# Altium schematic symbol library IC_ADI.SCHLIB: 3169 symbols (part 27 of 181)
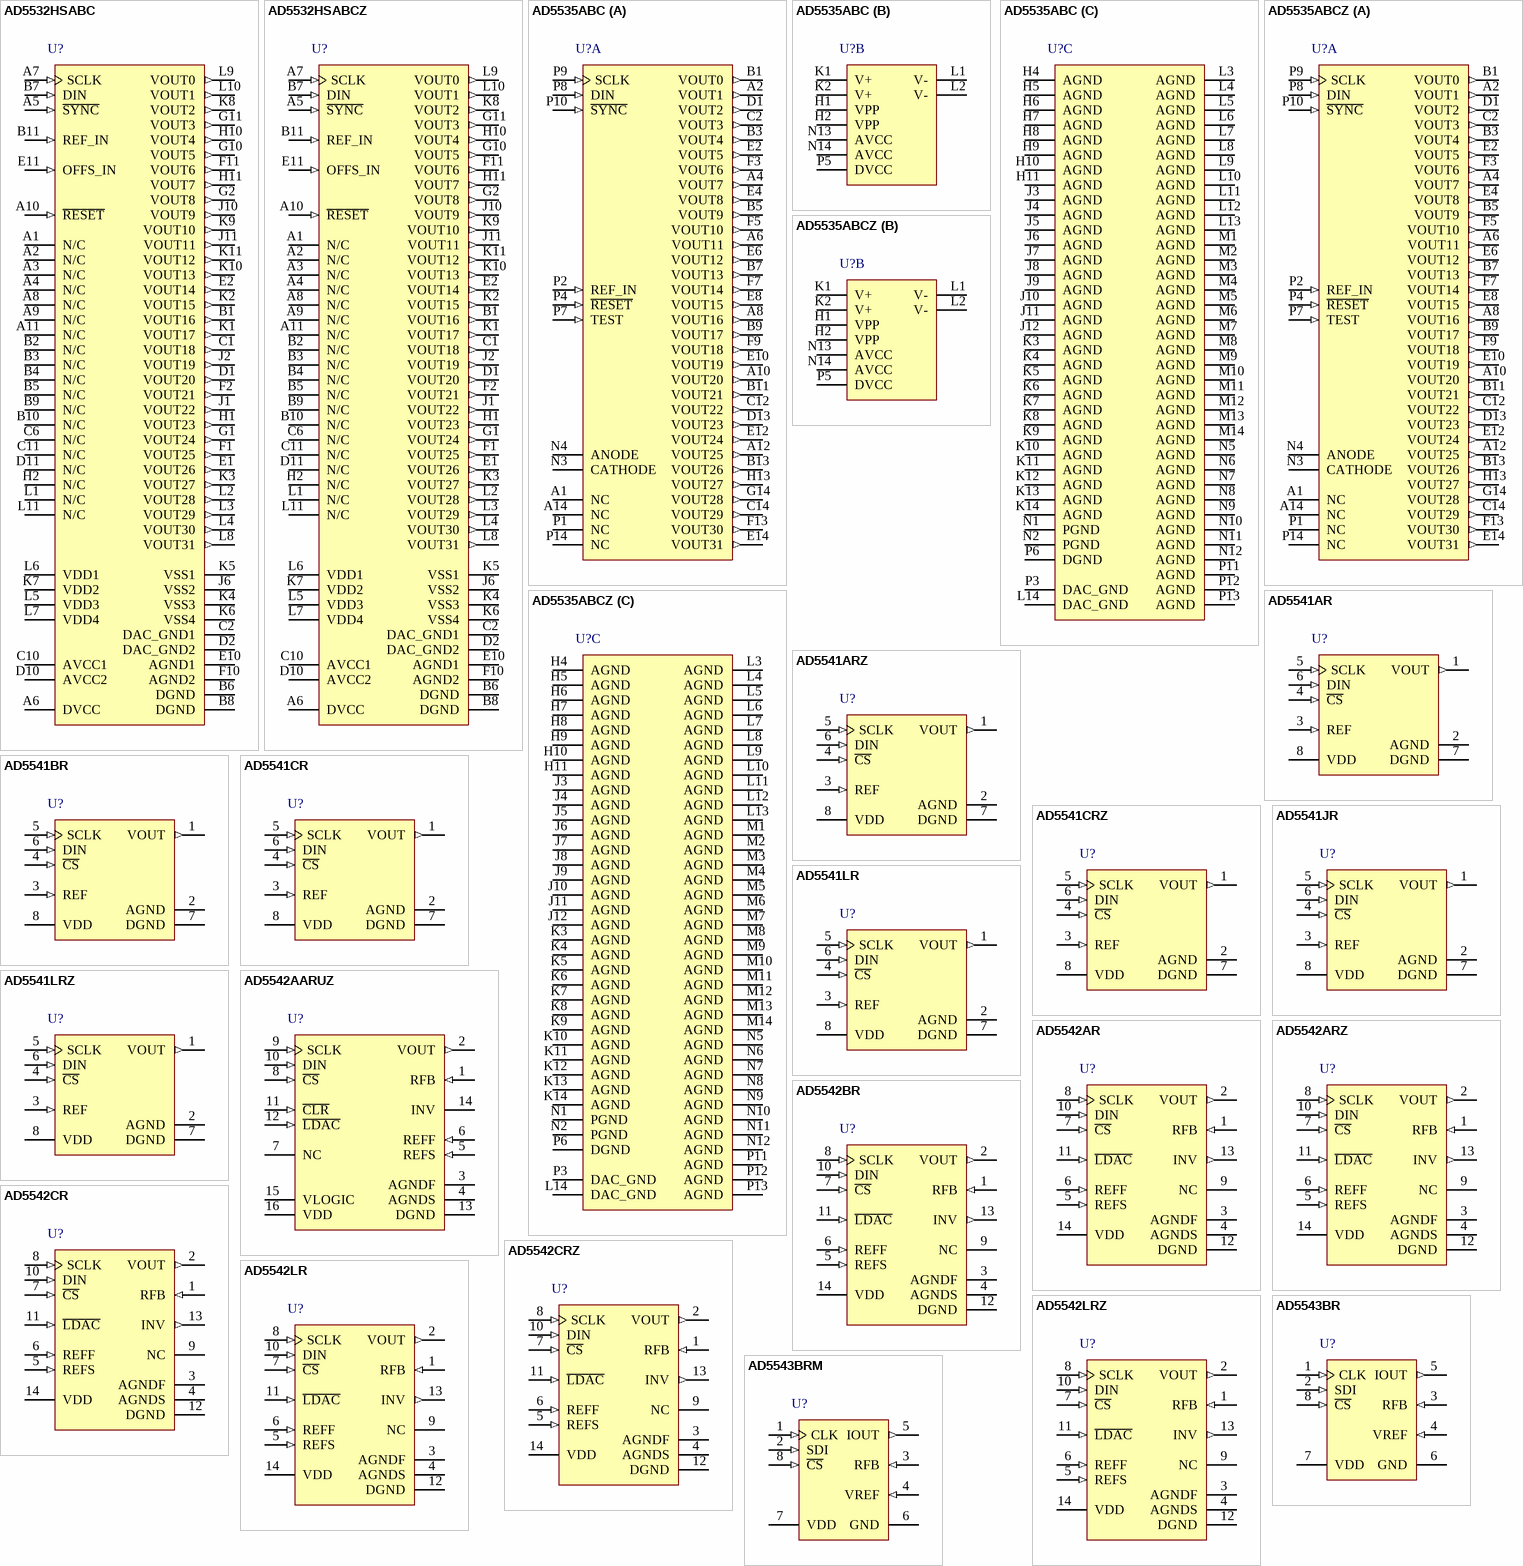
[diagram p217: symbols AD5532HSABC to AD5543BRM]

## AD5541AR
designator U?
Single 16-Bit Digital-to-Analog Converter with Serial Interface, 2.7 to 5.5 V, -40 to +85 degC, R-8, Tube; Generic Part Number: AD5541; PartNumber: AD5541AR; # DAC Outputs: 1; Max V+: 5.5V; Op Pwr Diss: 6.05mW; Resolution (Bits): 16; Settling Time: 1祍; Single Supply: Yes; DatasheetVersion: Rev.F; PackageVersion: 060506-A; PackageReference: R-8; PackageDescription: 8-Lead Standard Small Outline Package [SOIC_N] Narrow Body; Supplier Part Number 1: AD5541AR-ND; Supplier Part Number 2: 584-AD5541AR; Packing: Tube; RoHS: N; Mounting Technology: Surface Mount; Code_JEDEC: MS-012-AA; Code_IPC: SOIC127P600-8; ComponentLink1Description: Manufacturer URL; ComponentLink2Description: Datasheet; ComponentLink3Description: Package Specification; ComponentLink4Description: Product URL; ComponentLink5Description: Reference Design URL
footprint SOIC8_1.27 (Footprint not found)
pins: 1 VOUT (out) "Analog Output Voltage from the DAC.", 2 AGND (power) "Ground Reference Point for Analog Circuitry.", 3 REF (in) "Voltage Reference Input for the DAC. Connect to an external 2.5 V reference. Reference can range from 2 V to VDD.", 4 ~{CS} (in) "Logic Input Signal. The chip select signal is used to frame the serial data input.", 5 SCLK (in) "Clock Input. Data is clocked into the input register on the rising edge of SCLK. Duty cycle must be between 40% and 60%.", 6 DIN (in) "Serial Data Input. This device accepts 16-bit words. Data is clocked into the input register on the rising edge of SCLK.", 7 DGND (power) "Digital Ground. Ground reference for digital circuitry.", 8 VDD (power) "Analog Supply Voltage, 5 V +/- 10%."

## AD5541ARZ
designator U?
Single 16-Bit Digital-to-Analog Converter with Serial Interface, 2.7 to 5.5 V, -40 to +85 degC, R-8, Pb-Free, Tube; Generic Part Number: AD5541; PartNumber: AD5541ARZ; # DAC Outputs: 1; Max V+: 5.5V; Op Pwr Diss: 6.05mW; Resolution (Bits): 16; Settling Time: 1祍; Single Supply: Yes; DatasheetVersion: Rev.F; PackageVersion: 060506-A; PackageReference: R-8; PackageDescription: 8-Lead Standard Small Outline Package [SOIC_N] Narrow Body; Supplier Part Number 1: AD5541ARZ-ND; Supplier Part Number 2: 1838895; Supplier Part Number 3: 19M8816; Supplier Part Number 4: 584-AD5541ARZ; Packing: Tube; RoHS: Y; Mounting Technology: Surface Mount; Code_JEDEC: MS-012-AA; Code_IPC: SOIC127P600-8; ComponentLink1Description: Manufacturer URL; ComponentLink2Description: Datasheet; ComponentLink3Description: Package Specification; ComponentLink4Description: Product URL; ComponentLink5Description: Reference Design URL
footprint SOIC8_1.27 (Footprint not found)
pins: 1 VOUT (out) "Analog Output Voltage from the DAC.", 2 AGND (power) "Ground Reference Point for Analog Circuitry.", 3 REF (in) "Voltage Reference Input for the DAC. Connect to an external 2.5 V reference. Reference can range from 2 V to VDD.", 4 ~{CS} (in) "Logic Input Signal. The chip select signal is used to frame the serial data input.", 5 SCLK (in) "Clock Input. Data is clocked into the input register on the rising edge of SCLK. Duty cycle must be between 40% and 60%.", 6 DIN (in) "Serial Data Input. This device accepts 16-bit words. Data is clocked into the input register on the rising edge of SCLK.", 7 DGND (power) "Digital Ground. Ground reference for digital circuitry.", 8 VDD (power) "Analog Supply Voltage, 5 V +/- 10%."

## AD5541BR
designator U?
Single 16-Bit Digital-to-Analog Converter with Serial Interface, 2.7 to 5.5 V, -40 to +85 degC, R-8, Tube; Generic Part Number: AD5541; PartNumber: AD5541BR; # DAC Outputs: 1; Max V+: 5.5V; Op Pwr Diss: 6.05mW; Resolution (Bits): 16; Settling Time: 1祍; Single Supply: Yes; DatasheetVersion: Rev.F; PackageVersion: 060506-A; PackageReference: R-8; PackageDescription: 8-Lead Standard Small Outline Package [SOIC_N] Narrow Body; Supplier Part Number 1: AD5541BR-ND; Supplier Part Number 2: 584-AD5541BR; Packing: Tube; RoHS: N; Mounting Technology: Surface Mount; Code_JEDEC: MS-012-AA; Code_IPC: SOIC127P600-8; ComponentLink1Description: Manufacturer URL; ComponentLink2Description: Datasheet; ComponentLink3Description: Package Specification; ComponentLink4Description: Product URL; ComponentLink5Description: Reference Design URL
footprint SOIC8_1.27 (Footprint not found)
pins: 1 VOUT (out) "Analog Output Voltage from the DAC.", 2 AGND (power) "Ground Reference Point for Analog Circuitry.", 3 REF (in) "Voltage Reference Input for the DAC. Connect to an external 2.5 V reference. Reference can range from 2 V to VDD.", 4 ~{CS} (in) "Logic Input Signal. The chip select signal is used to frame the serial data input.", 5 SCLK (in) "Clock Input. Data is clocked into the input register on the rising edge of SCLK. Duty cycle must be between 40% and 60%.", 6 DIN (in) "Serial Data Input. This device accepts 16-bit words. Data is clocked into the input register on the rising edge of SCLK.", 7 DGND (power) "Digital Ground. Ground reference for digital circuitry.", 8 VDD (power) "Analog Supply Voltage, 5 V +/- 10%."

## AD5541CR
designator U?
Single 16-Bit Digital-to-Analog Converter with Serial Interface, 2.7 to 5.5 V, -40 to +85 degC, R-8, Tube; Generic Part Number: AD5541; PartNumber: AD5541CR; # DAC Outputs: 1; Max V+: 5.5V; Op Pwr Diss: 6.05mW; Resolution (Bits): 16; Settling Time: 1祍; Single Supply: Yes; DatasheetVersion: Rev.F; PackageVersion: 060506-A; PackageReference: R-8; PackageDescription: 8-Lead Standard Small Outline Package [SOIC_N] Narrow Body; Supplier Part Number 1: AD5541CR-ND; Supplier Part Number 2: 584-AD5541CR; Packing: Tube; RoHS: N; Mounting Technology: Surface Mount; Code_JEDEC: MS-012-AA; Code_IPC: SOIC127P600-8; ComponentLink1Description: Manufacturer URL; ComponentLink2Description: Datasheet; ComponentLink3Description: Package Specification; ComponentLink4Description: Product URL; ComponentLink5Description: Reference Design URL
footprint SOIC8_1.27 (Footprint not found)
pins: 1 VOUT (out) "Analog Output Voltage from the DAC.", 2 AGND (power) "Ground Reference Point for Analog Circuitry.", 3 REF (in) "Voltage Reference Input for the DAC. Connect to an external 2.5 V reference. Reference can range from 2 V to VDD.", 4 ~{CS} (in) "Logic Input Signal. The chip select signal is used to frame the serial data input.", 5 SCLK (in) "Clock Input. Data is clocked into the input register on the rising edge of SCLK. Duty cycle must be between 40% and 60%.", 6 DIN (in) "Serial Data Input. This device accepts 16-bit words. Data is clocked into the input register on the rising edge of SCLK.", 7 DGND (power) "Digital Ground. Ground reference for digital circuitry.", 8 VDD (power) "Analog Supply Voltage, 5 V +/- 10%."

## AD5541CRZ
designator U?
Single 16-Bit Digital-to-Analog Converter with Serial Interface, 2.7 to 5.5 V, -40 to +85 degC, R-8, Pb-Free, Tube; Generic Part Number: AD5541; PartNumber: AD5541CRZ; # DAC Outputs: 1; Max V+: 5.5V; Op Pwr Diss: 6.05mW; Resolution (Bits): 16; Settling Time: 1祍; Single Supply: Yes; DatasheetVersion: Rev.F; PackageVersion: 060506-A; PackageReference: R-8; PackageDescription: 8-Lead Standard Small Outline Package [SOIC_N] Narrow Body; Supplier Part Number 1: AD5541CRZ-ND; Supplier Part Number 2: 59K4208; Supplier Part Number 3: 584-AD5541CRZ; Packing: Tube; RoHS: Y; Mounting Technology: Surface Mount; Code_JEDEC: MS-012-AA; Code_IPC: SOIC127P600-8; ComponentLink1Description: Manufacturer URL; ComponentLink2Description: Datasheet; ComponentLink3Description: Package Specification; ComponentLink4Description: Product URL; ComponentLink5Description: Reference Design URL
footprint SOIC8_1.27 (Footprint not found)
pins: 1 VOUT (out) "Analog Output Voltage from the DAC.", 2 AGND (power) "Ground Reference Point for Analog Circuitry.", 3 REF (in) "Voltage Reference Input for the DAC. Connect to an external 2.5 V reference. Reference can range from 2 V to VDD.", 4 ~{CS} (in) "Logic Input Signal. The chip select signal is used to frame the serial data input.", 5 SCLK (in) "Clock Input. Data is clocked into the input register on the rising edge of SCLK. Duty cycle must be between 40% and 60%.", 6 DIN (in) "Serial Data Input. This device accepts 16-bit words. Data is clocked into the input register on the rising edge of SCLK.", 7 DGND (power) "Digital Ground. Ground reference for digital circuitry.", 8 VDD (power) "Analog Supply Voltage, 5 V +/- 10%."

## AD5541JR
designator U?
Single 16-Bit Digital-to-Analog Converter with Serial Interface, 2.7 to 5.5 V, 0 to +70 degC, R-8, Tube; Generic Part Number: AD5541; PartNumber: AD5541JR; # DAC Outputs: 1; Max V+: 5.5V; Op Pwr Diss: 6.05mW; Resolution (Bits): 16; Settling Time: 1祍; Single Supply: Yes; DatasheetVersion: Rev.F; PackageVersion: 060506-A; PackageReference: R-8; PackageDescription: 8-Lead Standard Small Outline Package [SOIC_N] Narrow Body; Supplier Part Number 1: AD5541JR-ND; Supplier Part Number 2: 584-AD5541JR; Packing: Tube; RoHS: N; Mounting Technology: Surface Mount; Code_JEDEC: MS-012-AA; Code_IPC: SOIC127P600-8; ComponentLink1Description: Manufacturer URL; ComponentLink2Description: Datasheet; ComponentLink3Description: Package Specification; ComponentLink4Description: Product URL; ComponentLink5Description: Reference Design URL
footprint SOIC8_1.27 (Footprint not found)
pins: 1 VOUT (out) "Analog Output Voltage from the DAC.", 2 AGND (power) "Ground Reference Point for Analog Circuitry.", 3 REF (in) "Voltage Reference Input for the DAC. Connect to an external 2.5 V reference. Reference can range from 2 V to VDD.", 4 ~{CS} (in) "Logic Input Signal. The chip select signal is used to frame the serial data input.", 5 SCLK (in) "Clock Input. Data is clocked into the input register on the rising edge of SCLK. Duty cycle must be between 40% and 60%.", 6 DIN (in) "Serial Data Input. This device accepts 16-bit words. Data is clocked into the input register on the rising edge of SCLK.", 7 DGND (power) "Digital Ground. Ground reference for digital circuitry.", 8 VDD (power) "Analog Supply Voltage, 5 V +/- 10%."

## AD5541LR
designator U?
Single 16-Bit Digital-to-Analog Converter with Serial Interface, 2.7 to 5.5 V, 0 to +70 degC, R-8, Tube; Generic Part Number: AD5541; PartNumber: AD5541LR; # DAC Outputs: 1; Max V+: 5.5V; Op Pwr Diss: 6.05mW; Resolution (Bits): 16; Settling Time: 1祍; Single Supply: Yes; DatasheetVersion: Rev.F; PackageVersion: 060506-A; PackageReference: R-8; PackageDescription: 8-Lead Standard Small Outline Package [SOIC_N] Narrow Body; Supplier Part Number 1: AD5541LR-ND; Supplier Part Number 2: 584-AD5541LR; Packing: Tube; RoHS: N; Mounting Technology: Surface Mount; Code_JEDEC: MS-012-AA; Code_IPC: SOIC127P600-8; ComponentLink1Description: Manufacturer URL; ComponentLink2Description: Datasheet; ComponentLink3Description: Package Specification; ComponentLink4Description: Product URL; ComponentLink5Description: Reference Design URL
footprint SOIC8_1.27 (Footprint not found)
pins: 1 VOUT (out) "Analog Output Voltage from the DAC.", 2 AGND (power) "Ground Reference Point for Analog Circuitry.", 3 REF (in) "Voltage Reference Input for the DAC. Connect to an external 2.5 V reference. Reference can range from 2 V to VDD.", 4 ~{CS} (in) "Logic Input Signal. The chip select signal is used to frame the serial data input.", 5 SCLK (in) "Clock Input. Data is clocked into the input register on the rising edge of SCLK. Duty cycle must be between 40% and 60%.", 6 DIN (in) "Serial Data Input. This device accepts 16-bit words. Data is clocked into the input register on the rising edge of SCLK.", 7 DGND (power) "Digital Ground. Ground reference for digital circuitry.", 8 VDD (power) "Analog Supply Voltage, 5 V +/- 10%."

## AD5541LRZ
designator U?
Single 16-Bit Digital-to-Analog Converter with Serial Interface, 2.7 to 5.5 V, 0 to +70 degC, R-8, Pb-Free, Tube; Generic Part Number: AD5541; PartNumber: AD5541LRZ; # DAC Outputs: 1; Max V+: 5.5V; Op Pwr Diss: 6.05mW; Resolution (Bits): 16; Settling Time: 1祍; Single Supply: Yes; DatasheetVersion: Rev.F; PackageVersion: 060506-A; PackageReference: R-8; PackageDescription: 8-Lead Standard Small Outline Package [SOIC_N] Narrow Body; Supplier Part Number 1: AD5541LRZ-ND; Supplier Part Number 2: 59K4211; Supplier Part Number 3: 584-AD5541LRZ; Packing: Tube; RoHS: Y; Mounting Technology: Surface Mount; Code_JEDEC: MS-012-AA; Code_IPC: SOIC127P600-8; ComponentLink1Description: Manufacturer URL; ComponentLink2Description: Datasheet; ComponentLink3Description: Package Specification; ComponentLink4Description: Product URL; ComponentLink5Description: Reference Design URL
footprint SOIC8_1.27 (Footprint not found)
pins: 1 VOUT (out) "Analog Output Voltage from the DAC.", 2 AGND (power) "Ground Reference Point for Analog Circuitry.", 3 REF (in) "Voltage Reference Input for the DAC. Connect to an external 2.5 V reference. Reference can range from 2 V to VDD.", 4 ~{CS} (in) "Logic Input Signal. The chip select signal is used to frame the serial data input.", 5 SCLK (in) "Clock Input. Data is clocked into the input register on the rising edge of SCLK. Duty cycle must be between 40% and 60%.", 6 DIN (in) "Serial Data Input. This device accepts 16-bit words. Data is clocked into the input register on the rising edge of SCLK.", 7 DGND (power) "Digital Ground. Ground reference for digital circuitry.", 8 VDD (power) "Analog Supply Voltage, 5 V +/- 10%."

## AD5542AARUZ
designator U?
Single 16-Bit Digital-to-Analog Converter with Serial Interface, 2.7 to 5.5 V, -40 to +85 degC, RU-16, Pb-Free, Tube; Generic Part Number: AD5542A; PartNumber: AD5542AARUZ; # DAC Outputs: 1; Max V+: 5.5V; Op Pwr Diss: 1.5mW; Resolution (Bits): 16; Settling Time: 1祍; Single Supply: Yes; DatasheetVersion: Rev.A; PackageVersion: Nov-2002; PackageReference: RU-16; PackageDescription: 16-Lead Thin Shrink Small Outline Package [TSSOP]; Supplier Part Number 1: AD5542AARUZ-ND; Supplier Part Number 2: 18T2123; Supplier Part Number 3: 584-AD5542AARUZ; Packing: Tube; RoHS: Y; Mounting Technology: Surface Mount; Code_JEDEC: MO-153-AB; ComponentLink1Description: Manufacturer URL; ComponentLink2Description: Datasheet; ComponentLink3Description: Package Specification; ComponentLink4Description: Product URL
footprint TSSOP16_0.65 (Footprint not found)
pins: 1 RFB (in) "Feedback Resistor Pin. In bipolar mode, connect this pin to the external op amp output.", 2 VOUT (out) "Analog Output Voltage from the DAC.", 3 AGNDF (power) "Ground Reference Point for Analog Circuitry (Force).", 4 AGNDS (power) "Ground Reference Point for Analog Circuitry (Sense).", 5 REFS (in) "Voltage Reference Input (Sense) for the DAC. Connect to an external 2.5 V reference. Reference can range from 2 V to VDD.", 6 REFF (in) "Voltage Reference Input (Force) for the DAC. Connect to an external 2.5 V reference. Reference can range from 2 V to VDD.", 7 NC "No Connect.", 8 ~{CS} (in) "Logic Input Signal. The chip select signal is used to frame the serial data input.", 9 SCLK (in) "Clock Input. Data is clocked into the input register on the rising edge of SCLK. Duty cycle must be between 40% and 60%.", 10 DIN (in) "Serial Data Input. This device accepts 16-bit words. Data is clocked into the input register on the rising edge of SCLK.", 11 ~{CLR} (in) "Asynchronous Clear Input. The C\L\R\ input is falling edge sensitive. When C\L\R\ is low, all L\D\A\C\ pulses are ignored. When C\L\R\ is activated, the DAC register is cleared to the model selectable midscale.", 12 ~{LDAC} (in) "L\D\A\C\ Input. When this input is taken low, the DAC register is simultaneously updated with the contents of the input register.", 13 DGND (power) "Digital Ground. Ground reference for digital circuitry.", 14 INV "Connection to the Internal Scaling Resistors of the DAC. Connect the INV pin to the external op amps inverting input in bipolar mode.", 15 VLOGIC (power) "Logic Power Supply.", 16 VDD (power) "Analog Supply Voltage, 5 V +/- 10%."

## AD5542AR
designator U?
Single 16-Bit Digital-to-Analog Converter with Serial Interface, 2.7 to 5.5 V, -40 to +85 degC, R-14, Tube; Generic Part Number: AD5542; PartNumber: AD5542AR; # DAC Outputs: 1; Max V+: 5.5V; Op Pwr Diss: 6.05mW; Resolution (Bits): 16; Settling Time: 1祍; Single Supply: Yes; DatasheetVersion: Rev.F; PackageVersion: 060606-A; PackageReference: R-14; PackageDescription: 14-Lead Standard Small Outline Package [SOIC_N]; Supplier Part Number 1: AD5542AR-ND; Supplier Part Number 2: 584-AD5542AR; Packing: Tube; RoHS: N; Mounting Technology: Surface Mount; Code_JEDEC: MS-012-AB; Code_IPC: SOIC127P600-14; ComponentLink1Description: Manufacturer URL; ComponentLink2Description: Datasheet; ComponentLink3Description: Package Specification; ComponentLink4Description: Product URL; ComponentLink5Description: Reference Design URL
footprint SOIC14_1.27 (Footprint not found)
pins: 1 RFB (in) "Feedback Resistor Pin. In bipolar mode, connect this pin to the external op amp output.", 2 VOUT (out) "Analog Output Voltage from the DAC.", 3 AGNDF (power) "Ground Reference Point for Analog Circuitry (Force).", 4 AGNDS (power) "Ground Reference Point for Analog Circuitry (Sense).", 5 REFS (in) "Voltage Reference Input (Sense) for the DAC. Connect to an external 2.5 V reference. Reference can range from 2 V to VDD.", 6 REFF (in) "Voltage Reference Input (Force) for the DAC. Connect to an external 2.5 V reference. Reference can range from 2 V to VDD.", 7 ~{CS} (in) "Logic Input Signal. The chip select signal is used to frame the serial data input.", 8 SCLK (in) "Clock Input. Data is clocked into the input register on the rising edge of SCLK. Duty cycle must be between 40% and 60%.", 9 NC "No Connect.", 10 DIN (in) "Serial Data Input. This device accepts 16-bit words. Data is clocked into the input register on the rising edge of SCLK.", 11 ~{LDAC} (in) "L\D\A\C\ Input. When this input is taken low, the DAC register is simultaneously updated with the contents of the input register.", 12 DGND (power) "Digital Ground. Ground reference for digital circuitry.", 13 INV (out) "Connected to the Internal Scaling Resistors of the DAC. Connect the INV pin to external op amps inverting input in bipolar mode", 14 VDD (power) "Analog Supply Voltage, 5 V +/- 10%."

## AD5542ARZ
designator U?
Single 16-Bit Digital-to-Analog Converter with Serial Interface, 2.7 to 5.5 V, -40 to +85 degC, R-14, Pb-Free, Tube; Generic Part Number: AD5542; PartNumber: AD5542ARZ; # DAC Outputs: 1; Max V+: 5.5V; Op Pwr Diss: 6.05mW; Resolution (Bits): 16; Settling Time: 1祍; Single Supply: Yes; DatasheetVersion: Rev.F; PackageVersion: 060606-A; PackageReference: R-14; PackageDescription: 14-Lead Standard Small Outline Package [SOIC_N]; Supplier Part Number 1: AD5542ARZ-ND; Supplier Part Number 2: 59K4213; Supplier Part Number 3: 584-AD5542ARZ; Packing: Tube; RoHS: Y; Mounting Technology: Surface Mount; Code_JEDEC: MS-012-AB; Code_IPC: SOIC127P600-14; ComponentLink1Description: Manufacturer URL; ComponentLink2Description: Datasheet; ComponentLink3Description: Package Specification; ComponentLink4Description: Product URL; ComponentLink5Description: Reference Design URL
footprint SOIC14_1.27 (Footprint not found)
pins: 1 RFB (in) "Feedback Resistor Pin. In bipolar mode, connect this pin to the external op amp output.", 2 VOUT (out) "Analog Output Voltage from the DAC.", 3 AGNDF (power) "Ground Reference Point for Analog Circuitry (Force).", 4 AGNDS (power) "Ground Reference Point for Analog Circuitry (Sense).", 5 REFS (in) "Voltage Reference Input (Sense) for the DAC. Connect to an external 2.5 V reference. Reference can range from 2 V to VDD.", 6 REFF (in) "Voltage Reference Input (Force) for the DAC. Connect to an external 2.5 V reference. Reference can range from 2 V to VDD.", 7 ~{CS} (in) "Logic Input Signal. The chip select signal is used to frame the serial data input.", 8 SCLK (in) "Clock Input. Data is clocked into the input register on the rising edge of SCLK. Duty cycle must be between 40% and 60%.", 9 NC "No Connect.", 10 DIN (in) "Serial Data Input. This device accepts 16-bit words. Data is clocked into the input register on the rising edge of SCLK.", 11 ~{LDAC} (in) "L\D\A\C\ Input. When this input is taken low, the DAC register is simultaneously updated with the contents of the input register.", 12 DGND (power) "Digital Ground. Ground reference for digital circuitry.", 13 INV (out) "Connected to the Internal Scaling Resistors of the DAC. Connect the INV pin to external op amps inverting input in bipolar mode", 14 VDD (power) "Analog Supply Voltage, 5 V +/- 10%."

## AD5542BR
designator U?
Single 16-Bit Digital-to-Analog Converter with Serial Interface, 2.7 to 5.5 V, -40 to +85 degC, R-14, Tube; Generic Part Number: AD5542; PartNumber: AD5542BR; # DAC Outputs: 1; Max V+: 5.5V; Op Pwr Diss: 6.05mW; Resolution (Bits): 16; Settling Time: 1祍; Single Supply: Yes; DatasheetVersion: Rev.F; PackageVersion: 060606-A; PackageReference: R-14; PackageDescription: 14-Lead Standard Small Outline Package [SOIC_N]; Supplier Part Number 1: AD5542BR-ND; Supplier Part Number 2: 584-AD5542BR; Packing: Tube; RoHS: N; Mounting Technology: Surface Mount; Code_JEDEC: MS-012-AB; Code_IPC: SOIC127P600-14; ComponentLink1Description: Manufacturer URL; ComponentLink2Description: Datasheet; ComponentLink3Description: Package Specification; ComponentLink4Description: Product URL; ComponentLink5Description: Reference Design URL
footprint SOIC14_1.27 (Footprint not found)
pins: 1 RFB (in) "Feedback Resistor Pin. In bipolar mode, connect this pin to the external op amp output.", 2 VOUT (out) "Analog Output Voltage from the DAC.", 3 AGNDF (power) "Ground Reference Point for Analog Circuitry (Force).", 4 AGNDS (power) "Ground Reference Point for Analog Circuitry (Sense).", 5 REFS (in) "Voltage Reference Input (Sense) for the DAC. Connect to an external 2.5 V reference. Reference can range from 2 V to VDD.", 6 REFF (in) "Voltage Reference Input (Force) for the DAC. Connect to an external 2.5 V reference. Reference can range from 2 V to VDD.", 7 ~{CS} (in) "Logic Input Signal. The chip select signal is used to frame the serial data input.", 8 SCLK (in) "Clock Input. Data is clocked into the input register on the rising edge of SCLK. Duty cycle must be between 40% and 60%.", 9 NC "No Connect.", 10 DIN (in) "Serial Data Input. This device accepts 16-bit words. Data is clocked into the input register on the rising edge of SCLK.", 11 ~{LDAC} (in) "L\D\A\C\ Input. When this input is taken low, the DAC register is simultaneously updated with the contents of the input register.", 12 DGND (power) "Digital Ground. Ground reference for digital circuitry.", 13 INV (out) "Connected to the Internal Scaling Resistors of the DAC. Connect the INV pin to external op amps inverting input in bipolar mode", 14 VDD (power) "Analog Supply Voltage, 5 V +/- 10%."

## AD5542CR
designator U?
Single 16-Bit Digital-to-Analog Converter with Serial Interface, 2.7 to 5.5 V, -40 to +85 degC, R-14, Tube; Generic Part Number: AD5542; PartNumber: AD5542CR; # DAC Outputs: 1; Max V+: 5.5V; Op Pwr Diss: 6.05mW; Resolution (Bits): 16; Settling Time: 1祍; Single Supply: Yes; DatasheetVersion: Rev.F; PackageVersion: 060606-A; PackageReference: R-14; PackageDescription: 14-Lead Standard Small Outline Package [SOIC_N]; Supplier Part Number 1: AD5542CR-ND; Supplier Part Number 2: 19C6866; Supplier Part Number 3: 584-AD5542CR; Packing: Tube; RoHS: N; Mounting Technology: Surface Mount; Code_JEDEC: MS-012-AB; Code_IPC: SOIC127P600-14; ComponentLink1Description: Manufacturer URL; ComponentLink2Description: Datasheet; ComponentLink3Description: Package Specification; ComponentLink4Description: Product URL; ComponentLink5Description: Reference Design URL
footprint SOIC14_1.27 (Footprint not found)
pins: 1 RFB (in) "Feedback Resistor Pin. In bipolar mode, connect this pin to the external op amp output.", 2 VOUT (out) "Analog Output Voltage from the DAC.", 3 AGNDF (power) "Ground Reference Point for Analog Circuitry (Force).", 4 AGNDS (power) "Ground Reference Point for Analog Circuitry (Sense).", 5 REFS (in) "Voltage Reference Input (Sense) for the DAC. Connect to an external 2.5 V reference. Reference can range from 2 V to VDD.", 6 REFF (in) "Voltage Reference Input (Force) for the DAC. Connect to an external 2.5 V reference. Reference can range from 2 V to VDD.", 7 ~{CS} (in) "Logic Input Signal. The chip select signal is used to frame the serial data input.", 8 SCLK (in) "Clock Input. Data is clocked into the input register on the rising edge of SCLK. Duty cycle must be between 40% and 60%.", 9 NC "No Connect.", 10 DIN (in) "Serial Data Input. This device accepts 16-bit words. Data is clocked into the input register on the rising edge of SCLK.", 11 ~{LDAC} (in) "L\D\A\C\ Input. When this input is taken low, the DAC register is simultaneously updated with the contents of the input register.", 12 DGND (power) "Digital Ground. Ground reference for digital circuitry.", 13 INV (out) "Connected to the Internal Scaling Resistors of the DAC. Connect the INV pin to external op amps inverting input in bipolar mode", 14 VDD (power) "Analog Supply Voltage, 5 V +/- 10%."

## AD5542CRZ
designator U?
Single 16-Bit Digital-to-Analog Converter with Serial Interface, 2.7 to 5.5 V, -40 to +85 degC, R-14, Pb-Free, Tube; Generic Part Number: AD5542; PartNumber: AD5542CRZ; # DAC Outputs: 1; Max V+: 5.5V; Op Pwr Diss: 6.05mW; Resolution (Bits): 16; Settling Time: 1祍; Single Supply: Yes; DatasheetVersion: Rev.F; PackageVersion: 060606-A; PackageReference: R-14; PackageDescription: 14-Lead Standard Small Outline Package [SOIC_N]; Supplier Part Number 1: AD5542CRZ-ND; Supplier Part Number 2: 1438374; Supplier Part Number 3: 15P0691; Supplier Part Number 4: 12M8556; Supplier Part Number 5: 584-AD5542CRZ; Packing: Tube; RoHS: Y; Mounting Technology: Surface Mount; Code_JEDEC: MS-012-AB; Code_IPC: SOIC127P600-14; ComponentLink1Description: Manufacturer URL; ComponentLink2Description: Datasheet; ComponentLink3Description: Package Specification; ComponentLink4Description: Product URL; ComponentLink5Description: Reference Design URL
footprint SOIC14_1.27 (Footprint not found)
pins: 1 RFB (in) "Feedback Resistor Pin. In bipolar mode, connect this pin to the external op amp output.", 2 VOUT (out) "Analog Output Voltage from the DAC.", 3 AGNDF (power) "Ground Reference Point for Analog Circuitry (Force).", 4 AGNDS (power) "Ground Reference Point for Analog Circuitry (Sense).", 5 REFS (in) "Voltage Reference Input (Sense) for the DAC. Connect to an external 2.5 V reference. Reference can range from 2 V to VDD.", 6 REFF (in) "Voltage Reference Input (Force) for the DAC. Connect to an external 2.5 V reference. Reference can range from 2 V to VDD.", 7 ~{CS} (in) "Logic Input Signal. The chip select signal is used to frame the serial data input.", 8 SCLK (in) "Clock Input. Data is clocked into the input register on the rising edge of SCLK. Duty cycle must be between 40% and 60%.", 9 NC "No Connect.", 10 DIN (in) "Serial Data Input. This device accepts 16-bit words. Data is clocked into the input register on the rising edge of SCLK.", 11 ~{LDAC} (in) "L\D\A\C\ Input. When this input is taken low, the DAC register is simultaneously updated with the contents of the input register.", 12 DGND (power) "Digital Ground. Ground reference for digital circuitry.", 13 INV (out) "Connected to the Internal Scaling Resistors of the DAC. Connect the INV pin to external op amps inverting input in bipolar mode", 14 VDD (power) "Analog Supply Voltage, 5 V +/- 10%."

## AD5542LR
designator U?
Single 16-Bit Digital-to-Analog Converter with Serial Interface, 2.7 to 5.5 V, 0 to +70 degC, R-14, Tube; Generic Part Number: AD5542; PartNumber: AD5542LR; # DAC Outputs: 1; Max V+: 5.5V; Op Pwr Diss: 6.05mW; Resolution (Bits): 16; Settling Time: 1祍; Single Supply: Yes; DatasheetVersion: Rev.F; PackageVersion: 060606-A; PackageReference: R-14; PackageDescription: 14-Lead Standard Small Outline Package [SOIC_N]; Supplier Part Number 1: AD5542LR-ND; Supplier Part Number 2: 584-AD5542LR; Packing: Tube; RoHS: N; Mounting Technology: Surface Mount; Code_JEDEC: MS-012-AB; Code_IPC: SOIC127P600-14; ComponentLink1Description: Manufacturer URL; ComponentLink2Description: Datasheet; ComponentLink3Description: Package Specification; ComponentLink4Description: Product URL; ComponentLink5Description: Reference Design URL
footprint SOIC14_1.27 (Footprint not found)
pins: 1 RFB (in) "Feedback Resistor Pin. In bipolar mode, connect this pin to the external op amp output.", 2 VOUT (out) "Analog Output Voltage from the DAC.", 3 AGNDF (power) "Ground Reference Point for Analog Circuitry (Force).", 4 AGNDS (power) "Ground Reference Point for Analog Circuitry (Sense).", 5 REFS (in) "Voltage Reference Input (Sense) for the DAC. Connect to an external 2.5 V reference. Reference can range from 2 V to VDD.", 6 REFF (in) "Voltage Reference Input (Force) for the DAC. Connect to an external 2.5 V reference. Reference can range from 2 V to VDD.", 7 ~{CS} (in) "Logic Input Signal. The chip select signal is used to frame the serial data input.", 8 SCLK (in) "Clock Input. Data is clocked into the input register on the rising edge of SCLK. Duty cycle must be between 40% and 60%.", 9 NC "No Connect.", 10 DIN (in) "Serial Data Input. This device accepts 16-bit words. Data is clocked into the input register on the rising edge of SCLK.", 11 ~{LDAC} (in) "L\D\A\C\ Input. When this input is taken low, the DAC register is simultaneously updated with the contents of the input register.", 12 DGND (power) "Digital Ground. Ground reference for digital circuitry.", 13 INV (out) "Connected to the Internal Scaling Resistors of the DAC. Connect the INV pin to external op amps inverting input in bipolar mode", 14 VDD (power) "Analog Supply Voltage, 5 V +/- 10%."

## AD5542LRZ
designator U?
Single 16-Bit Digital-to-Analog Converter with Serial Interface, 2.7 to 5.5 V, 0 to +70 degC, R-14, Pb-Free, Tube; Generic Part Number: AD5542; PartNumber: AD5542LRZ; # DAC Outputs: 1; Max V+: 5.5V; Op Pwr Diss: 6.05mW; Resolution (Bits): 16; Settling Time: 1祍; Single Supply: Yes; DatasheetVersion: Rev.F; PackageVersion: 060606-A; PackageReference: R-14; PackageDescription: 14-Lead Standard Small Outline Package [SOIC_N]; Supplier Part Number 1: AD5542LRZ-ND; Supplier Part Number 2: 1438375; Supplier Part Number 3: 15P0692; Supplier Part Number 4: 12M8559; Supplier Part Number 5: 584-AD5542LRZ; Packing: Tube; RoHS: Y; Mounting Technology: Surface Mount; Code_JEDEC: MS-012-AB; Code_IPC: SOIC127P600-14; ComponentLink1Description: Manufacturer URL; ComponentLink2Description: Datasheet; ComponentLink3Description: Package Specification; ComponentLink4Description: Product URL; ComponentLink5Description: Reference Design URL
footprint SOIC14_1.27 (Footprint not found)
pins: 1 RFB (in) "Feedback Resistor Pin. In bipolar mode, connect this pin to the external op amp output.", 2 VOUT (out) "Analog Output Voltage from the DAC.", 3 AGNDF (power) "Ground Reference Point for Analog Circuitry (Force).", 4 AGNDS (power) "Ground Reference Point for Analog Circuitry (Sense).", 5 REFS (in) "Voltage Reference Input (Sense) for the DAC. Connect to an external 2.5 V reference. Reference can range from 2 V to VDD.", 6 REFF (in) "Voltage Reference Input (Force) for the DAC. Connect to an external 2.5 V reference. Reference can range from 2 V to VDD.", 7 ~{CS} (in) "Logic Input Signal. The chip select signal is used to frame the serial data input.", 8 SCLK (in) "Clock Input. Data is clocked into the input register on the rising edge of SCLK. Duty cycle must be between 40% and 60%.", 9 NC "No Connect.", 10 DIN (in) "Serial Data Input. This device accepts 16-bit words. Data is clocked into the input register on the rising edge of SCLK.", 11 ~{LDAC} (in) "L\D\A\C\ Input. When this input is taken low, the DAC register is simultaneously updated with the contents of the input register.", 12 DGND (power) "Digital Ground. Ground reference for digital circuitry.", 13 INV (out) "Connected to the Internal Scaling Resistors of the DAC. Connect the INV pin to external op amps inverting input in bipolar mode", 14 VDD (power) "Analog Supply Voltage, 5 V +/- 10%."